# Altium footprint library TI Power Management Battery Management.PcbLib: 112 footprints (part 2 of 7)
Each footprint in its own frame and in the unit in brackets; x right, y up, seen from the top. Pads: shape width x height; smd on the part's side, far side on the other; paste and mask are expansions set on the pad; w line width, h text height; cw(c..) or ccw(c..) is an arc to the next point about the centre after c.
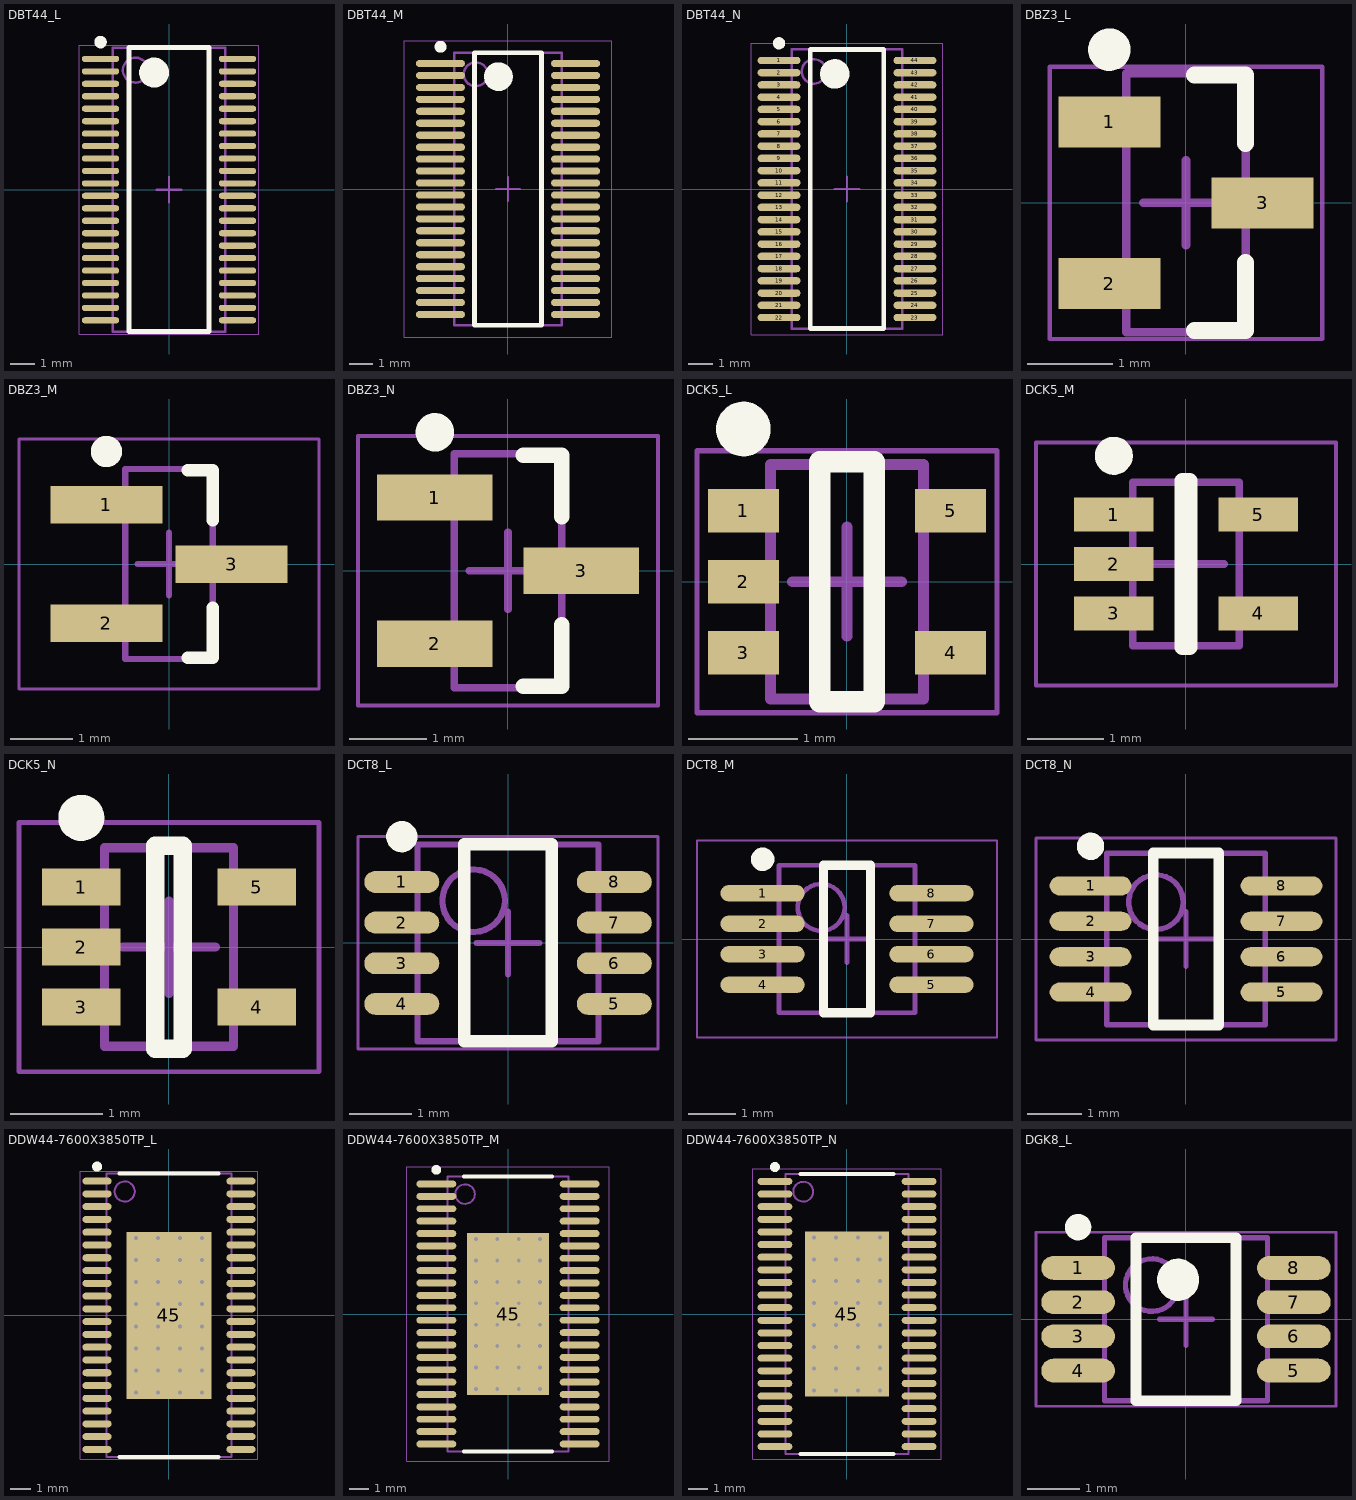
[diagram p1: the footprints below, top view; thin cyan lines are the x and y axes]

## DBT44_L [mm] "TSSOP, 44-Leads, Body 11.3x4.4mm, Pitch 0.5mm, IPC High Density"
height 1.2
pads (44):
  oval 1.5x0.25 smd: 1(-2.75,5.25) 2(-2.75,4.75) 3(-2.75,4.25) 4(-2.75,3.75) 5(-2.75,3.25) 6(-2.75,2.75) 7(-2.75,2.25) 8(-2.75,1.75) 9(-2.75,1.25) 10(-2.75,0.75) 11(-2.75,0.25) 12(-2.75,-0.25) 13(-2.75,-0.75) 14(-2.75,-1.25) 15(-2.75,-1.75) 16(-2.75,-2.25) 17(-2.75,-2.75) 18(-2.75,-3.25) 19(-2.75,-3.75) 20(-2.75,-4.25) 21(-2.75,-4.75) 22(-2.75,-5.25) 23(2.75,-5.25) 24(2.75,-4.75) 25(2.75,-4.25) 26(2.75,-3.75) 27(2.75,-3.25) 28(2.75,-2.75) 29(2.75,-2.25) 30(2.75,-1.75) 31(2.75,-1.25) 32(2.75,-0.75) 33(2.75,-0.25) 34(2.75,0.25) 35(2.75,0.75) 36(2.75,1.25) 37(2.75,1.75) 38(2.75,2.25) 39(2.75,2.75) 40(2.75,3.25) 41(2.75,3.75) 42(2.75,4.25) 43(2.75,4.75) 44(2.75,5.25)
Top Overlay:
  circle w0.25: c-2.75,5.925 r0.125
  circle w0.6: c-0.6,4.7 r0.3
  lines w0.2: -1.6,-5.7 -1.6,5.7 1.6,5.7 1.6,-5.7 -1.6,-5.7
Mechanical 13:
  circle w0.1: c-1.35,4.8 r0.5
  lines w0.1: -2.25,-5.7 -2.25,5.7 2.25,5.7 2.25,-5.7 -2.25,-5.7
Mechanical 15:
  lines w0.05: -3.6,-5.8 -3.6,5.8 3.6,5.8 3.6,-5.8 -3.6,-5.8
  lines w0.1: -0.5,0 0.5,0 ; 0,-0.5 0,0.5
3D body "User Library-TSSOP-44.step": height 1.2, standoff 0, extent -2.995,-5.95 2.995,5.95

## DBT44_M [mm] "TSSOP, 44-Leads, Body 11.3x4.4mm, Pitch 0.5mm, IPC Low Density"
height 1.2
pads (44):
  oval 2.05x0.3 smd: 1(-2.825,5.25) 2(-2.825,4.75) 3(-2.825,4.25) 4(-2.825,3.75) 5(-2.825,3.25) 6(-2.825,2.75) 7(-2.825,2.25) 8(-2.825,1.75) 9(-2.825,1.25) 10(-2.825,0.75) 11(-2.825,0.25) 12(-2.825,-0.25) 13(-2.825,-0.75) 14(-2.825,-1.25) 15(-2.825,-1.75) 16(-2.825,-2.25) 17(-2.825,-2.75) 18(-2.825,-3.25) 19(-2.825,-3.75) 20(-2.825,-4.25) 21(-2.825,-4.75) 22(-2.825,-5.25) 23(2.825,-5.25) 24(2.825,-4.75) 25(2.825,-4.25) 26(2.825,-3.75) 27(2.825,-3.25) 28(2.825,-2.75) 29(2.825,-2.25) 30(2.825,-1.75) 31(2.825,-1.25) 32(2.825,-0.75) 33(2.825,-0.25) 34(2.825,0.25) 35(2.825,0.75) 36(2.825,1.25) 37(2.825,1.75) 38(2.825,2.25) 39(2.825,2.75) 40(2.825,3.25) 41(2.825,3.75) 42(2.825,4.25) 43(2.825,4.75) 44(2.825,5.25)
Top Overlay:
  circle w0.6: c-0.4,4.7 r0.3
  circle w0.25: c-2.825,5.95 r0.125
  lines w0.2: -1.4,-5.7 1.4,-5.7 1.4,5.7 -1.4,5.7 -1.4,-5.7
Mechanical 13:
  circle w0.1: c-1.35,4.8 r0.5
  lines w0.1: -2.25,-5.7 2.25,-5.7 2.25,5.7 -2.25,5.7 -2.25,-5.7
Mechanical 15:
  lines w0.05: -4.35,-6.2 4.35,-6.2 4.35,6.2 -4.35,6.2 -4.35,-6.2
  lines w0.1: -0.5,0 0.5,0 ; 0,-0.5 0,0.5
3D body "User Library-TSSOP-44.step": height 1.2, standoff 0, extent -2.995,-5.95 2.995,5.95

## DBT44_N [mm] "TSSOP, 44-Leads, Body 11.3x4.4mm, Pitch 0.5mm, IPC Medium Density"
height 1.2
pads (44):
  oval 1.75x0.3 smd: 1(-2.775,5.25) 2(-2.775,4.75) 3(-2.775,4.25) 4(-2.775,3.75) 5(-2.775,3.25) 6(-2.775,2.75) 7(-2.775,2.25) 8(-2.775,1.75) 9(-2.775,1.25) 10(-2.775,0.75) 11(-2.775,0.25) 12(-2.775,-0.25) 13(-2.775,-0.75) 14(-2.775,-1.25) 15(-2.775,-1.75) 16(-2.775,-2.25) 17(-2.775,-2.75) 18(-2.775,-3.25) 19(-2.775,-3.75) 20(-2.775,-4.25) 21(-2.775,-4.75) 22(-2.775,-5.25) 23(2.775,-5.25) 24(2.775,-4.75) 25(2.775,-4.25) 26(2.775,-3.75) 27(2.775,-3.25) 28(2.775,-2.75) 29(2.775,-2.25) 30(2.775,-1.75) 31(2.775,-1.25) 32(2.775,-0.75) 33(2.775,-0.25) 34(2.775,0.25) 35(2.775,0.75) 36(2.775,1.25) 37(2.775,1.75) 38(2.775,2.25) 39(2.775,2.75) 40(2.775,3.25) 41(2.775,3.75) 42(2.775,4.25) 43(2.775,4.75) 44(2.775,5.25)
Top Overlay:
  circle w0.25: c-2.775,5.95 r0.125
  circle w0.6: c-0.5,4.7 r0.3
  lines w0.2: -1.5,-5.7 -1.5,5.7 1.5,5.7 1.5,-5.7 -1.5,-5.7
Mechanical 13:
  circle w0.1: c-1.35,4.8 r0.5
  lines w0.1: -2.25,-5.7 -2.25,5.7 2.25,5.7 2.25,-5.7 -2.25,-5.7
Mechanical 15:
  lines w0.05: -3.9,-5.95 -3.9,5.95 3.9,5.95 3.9,-5.95 -3.9,-5.95
  lines w0.1: -0.5,0 0.5,0 ; 0,-0.5 0,0.5
3D body "User Library-TSSOP-44.step": height 1.2, standoff 0, extent -2.995,-5.95 2.995,5.95

## DBZ3_L [mm] "SOT23, 3-Leads, Body 2.9x1.3mm, Pitch 0.95mm, Lead Span 2.4mm, IPC High Density"
height 1.12
pads (3):
  rect 1.2x0.6 smd: 1(-0.9,0.95) 2(-0.9,-0.95) 3(0.9,0)
Top Overlay:
  circle w0.25: c-0.9,1.8 r0.125
  lines w0.2: 0.1,-1.5 0.7,-1.5 0.7,-0.7 ; 0.1,1.5 0.7,1.5 0.7,0.7
Mechanical 13:
  lines w0.1: -0.7,-1.52 0.7,-1.52 0.7,1.52 -0.7,1.52 -0.7,-1.52
Mechanical 15:
  lines w0.05: -1.6,-1.6 1.6,-1.6 1.6,1.6 -1.6,1.6 -1.6,-1.6
  lines w0.1: -0.5,0 0.5,0 ; 0,-0.5 0,0.5
3D body "User Library-SOT23-3.step": height 1.3, standoff 0, extent -1.4,-1.45 1.4,1.45

## DBZ3_M [mm] "SOT23, 3-Leads, Body 2.9x1.3mm, Pitch 0.95mm, Lead Span 2.4mm, IPC Low Density"
height 1.12
pads (3):
  rect 1.8x0.6 smd: 1(-1,0.95) 2(-1,-0.95) 3(1,0)
Top Overlay:
  circle w0.25: c-1,1.8 r0.125
  lines w0.2: 0.3,-1.5 0.7,-1.5 0.7,-0.7 ; 0.3,1.5 0.7,1.5 0.7,0.7
Mechanical 13:
  lines w0.1: -0.7,-1.52 0.7,-1.52 0.7,1.52 -0.7,1.52 -0.7,-1.52
Mechanical 15:
  lines w0.05: -2.4,-2 2.4,-2 2.4,2 -2.4,2 -2.4,-2
  lines w0.1: -0.5,0 0.5,0 ; 0,-0.5 0,0.5
3D body "User Library-SOT23-3.step": height 1.3, standoff 0, extent -1.4,-1.45 1.4,1.45

## DBZ3_N [mm] "SOT23, 3-Leads, Body 2.9x1.3mm, Pitch 0.95mm, Lead Span 2.4mm, IPC Medium Density"
height 1.12
pads (3):
  rect 1.5x0.6 smd: 1(-0.95,0.95) 2(-0.95,-0.95) 3(0.95,0)
Top Overlay:
  circle w0.25: c-0.95,1.8 r0.125
  lines w0.2: 0.2,-1.5 0.7,-1.5 0.7,-0.7 ; 0.2,1.5 0.7,1.5 0.7,0.7
Mechanical 13:
  lines w0.1: -0.7,-1.52 -0.7,1.52 0.7,1.52 0.7,-1.52 -0.7,-1.52
Mechanical 15:
  lines w0.05: -1.95,-1.75 -1.95,1.75 1.95,1.75 1.95,-1.75 -1.95,-1.75
  lines w0.1: -0.5,0 0.5,0 ; 0,-0.5 0,0.5
3D body "User Library-SOT23-3.step": height 1.3, standoff 0, extent -1.4,-1.45 1.4,1.45

## DCK5_L [mm] "SOT353, 5-Leads, Body 2x1.3mm, Pitch 0.65mm, Lead Span 2.1mm, IPC High Density"
height 1.1
pads (5):
  rect 0.65x0.4 smd: 1(-0.95,0.65) 2(-0.95,0) 3(-0.95,-0.65) 4(0.95,-0.65) 5(0.95,0.65)
Top Overlay:
  circle w0.25: c-0.95,1.4 r0.125
  lines w0.2: -0.25,-1.1 0.25,-1.1 0.25,1.1 -0.25,1.1 -0.25,-1.1
Mechanical 13:
  lines w0.1: -0.7,-1.075 -0.7,1.075 0.7,1.075 0.7,-1.075 -0.7,-1.075
Mechanical 15:
  lines w0.05: -1.375,-1.2 -1.375,1.2 1.375,1.2 1.375,-1.2 -1.375,-1.2
  lines w0.1: -0.5,0 0.5,0 ; 0,-0.5 0,0.5
3D body "User Library-SOT353-1.step": height 1.1, standoff 0, extent -1.2,-1.1 1.2,1.1

## DCK5_M [mm] "SOT353, 5-Leads, Body 2x1.3mm, Pitch 0.65mm, Lead Span 2.1mm, IPC Low Density"
height 1.1
pads (5):
  rect 1.05x0.45 smd: 1(-0.95,0.65) 2(-0.95,0) 3(-0.95,-0.65) 4(0.95,-0.65) 5(0.95,0.65)
Top Overlay:
  circle w0.25: c-0.95,1.425 r0.125
  lines w0.2: -0.05,-1.1 -0.05,1.1 0.05,1.1 0.05,-1.1 -0.05,-1.1
Mechanical 13:
  lines w0.1: -0.7,-1.075 0.7,-1.075 0.7,1.075 -0.7,1.075 -0.7,-1.075
Mechanical 15:
  lines w0.05: -1.975,-1.6 1.975,-1.6 1.975,1.6 -1.975,1.6 -1.975,-1.6
  lines w0.1: -0.5,0 0.5,0 ; 0,-0.5 0,0.5
3D body "User Library-SOT353-1.step": height 1.1, standoff 0, extent -1.2,-1.1 1.2,1.1

## DCK5_N [mm] "SOT353, 5-Leads, Body 2x1.3mm, Pitch 0.65mm, Lead Span 2.1mm, IPC Medium Density"
height 1.1
pads (5):
  rect 0.85x0.4 smd: 1(-0.95,0.65) 2(-0.95,0) 3(-0.95,-0.65) 4(0.95,-0.65) 5(0.95,0.65)
Top Overlay:
  circle w0.25: c-0.95,1.4 r0.125
  lines w0.2: -0.15,-1.1 0.15,-1.1 0.15,1.1 -0.15,1.1 -0.15,-1.1
Mechanical 13:
  lines w0.1: -0.7,-1.075 -0.7,1.075 0.7,1.075 0.7,-1.075 -0.7,-1.075
Mechanical 15:
  lines w0.05: -1.625,-1.35 -1.625,1.35 1.625,1.35 1.625,-1.35 -1.625,-1.35
  lines w0.1: -0.5,0 0.5,0 ; 0,-0.5 0,0.5
3D body "User Library-SOT353-1.step": height 1.1, standoff 0, extent -1.2,-1.1 1.2,1.1

## DCT8_L [mm] "TSOP, 8-Leads, Body 3x2.8mm, Pitch 0.65mm, IPC High Density"
height 1.3
pads (8):
  oval 1.2x0.35 smd: 1(-1.7,0.975) 2(-1.7,0.325) 3(-1.7,-0.325) 4(-1.7,-0.975) 5(1.7,-0.975) 6(1.7,-0.325) 7(1.7,0.325) 8(1.7,0.975)
Top Overlay:
  circle w0.25: c-1.7,1.7 r0.125
  lines w0.2: -0.7,-1.575 0.7,-1.575 0.7,1.575 -0.7,1.575 -0.7,-1.575
Mechanical 13:
  circle w0.1: c-0.55,0.675 r0.5
  lines w0.1: -1.45,-1.575 1.45,-1.575 1.45,1.575 -1.45,1.575 -1.45,-1.575
Mechanical 15:
  lines w0.05: -2.4,-1.7 2.4,-1.7 2.4,1.7 -2.4,1.7 -2.4,-1.7
  lines w0.1: -0.5,0 0.5,0 ; 0,-0.5 0,0.5
3D body "User Library-SSOP-8-1.step": height 1.28, standoff -0.02, extent -2.148,-1.564 2.102,1.586

## DCT8_M [mm] "TSOP, 8-Leads, Body 3x2.8mm, Pitch 0.65mm, IPC Low Density"
height 1.3
pads (8):
  oval 1.8x0.35 smd: 1(-1.8,0.975) 2(-1.8,0.325) 3(-1.8,-0.325) 4(-1.8,-0.975) 5(1.8,-0.975) 6(1.8,-0.325) 7(1.8,0.325) 8(1.8,0.975)
Top Overlay:
  circle w0.25: c-1.8,1.7 r0.125
  lines w0.2: -0.5,-1.575 -0.5,1.575 0.5,1.575 0.5,-1.575 -0.5,-1.575
Mechanical 13:
  circle w0.1: c-0.55,0.675 r0.5
  lines w0.1: -1.45,-1.575 -1.45,1.575 1.45,1.575 1.45,-1.575 -1.45,-1.575
Mechanical 15:
  lines w0.05: -3.2,-2.1 -3.2,2.1 3.2,2.1 3.2,-2.1 -3.2,-2.1
  lines w0.1: -0.5,0 0.5,0 ; 0,-0.5 0,0.5
3D body "User Library-SSOP-8-1.step": height 1.28, standoff -0.02, extent -2.148,-1.59 2.102,1.56

## DCT8_N [mm] "TSOP, 8-Leads, Body 3x2.8mm, Pitch 0.65mm, IPC Medium Density"
height 1.3
pads (8):
  oval 1.5x0.35 smd: 1(-1.75,0.975) 2(-1.75,0.325) 3(-1.75,-0.325) 4(-1.75,-0.975) 5(1.75,-0.975) 6(1.75,-0.325) 7(1.75,0.325) 8(1.75,0.975)
Top Overlay:
  circle w0.25: c-1.75,1.7 r0.125
  lines w0.2: -0.6,-1.575 -0.6,1.575 0.6,1.575 0.6,-1.575 -0.6,-1.575
Mechanical 13:
  circle w0.1: c-0.55,0.675 r0.5
  lines w0.1: -1.45,-1.575 -1.45,1.575 1.45,1.575 1.45,-1.575 -1.45,-1.575
Mechanical 15:
  lines w0.05: -2.75,-1.85 -2.75,1.85 2.75,1.85 2.75,-1.85 -2.75,-1.85
  lines w0.1: -0.5,0 0.5,0 ; 0,-0.5 0,0.5
3D body "User Library-SSOP-8-1.step": height 1.28, standoff -0.02, extent -2.123,-1.564 2.127,1.586

## DDW44-7600X3850TP_L [mm] "TSOP, 44-Leads, Body 14x6.1mm, Pitch 0.635mm, Thermal Pad 8.3x4.2mm, IPC High Density"
height 1.2
pads (45):
  oval 1.45x0.35 smd: 1(-3.575,6.667) 2(-3.575,6.032) 3(-3.575,5.397) 4(-3.575,4.763) 5(-3.575,4.127) 6(-3.575,3.492) 7(-3.575,2.857) 8(-3.575,2.222) 9(-3.575,1.587) 10(-3.575,0.953) 11(-3.575,0.318) 12(-3.575,-0.318) 13(-3.575,-0.953) 14(-3.575,-1.587) 15(-3.575,-2.222) 16(-3.575,-2.857) 17(-3.575,-3.492) 18(-3.575,-4.127) 19(-3.575,-4.763) 20(-3.575,-5.397) 21(-3.575,-6.032) 22(-3.575,-6.667) 23(3.575,-6.667) 24(3.575,-6.032) 25(3.575,-5.397) 26(3.575,-4.763) 27(3.575,-4.127) 28(3.575,-3.492) 29(3.575,-2.857) 30(3.575,-2.222) 31(3.575,-1.587) 32(3.575,-0.953) 33(3.575,-0.318) 34(3.575,0.318) 35(3.575,0.953) 36(3.575,1.587) 37(3.575,2.222) 38(3.575,2.857) 39(3.575,3.492) 40(3.575,4.127) 41(3.575,4.763) 42(3.575,5.397) 43(3.575,6.032) 44(3.575,6.667)
  rect 4.2x8.3 smd: 45(0,0)
via -0.55,1.65 diameter 0.5 hole 0.2
via -0.55,0.55 diameter 0.5 hole 0.2
via -0.55,-0.55 diameter 0.5 hole 0.2
via -0.55,-1.65 diameter 0.5 hole 0.2
via -0.55,-2.75 diameter 0.5 hole 0.2
via 0.55,-2.75 diameter 0.5 hole 0.2
via 0.55,-1.65 diameter 0.5 hole 0.2
via 0.55,-0.55 diameter 0.5 hole 0.2
via 0.55,0.55 diameter 0.5 hole 0.2
via 0.55,1.65 diameter 0.5 hole 0.2
via 0.55,2.75 diameter 0.5 hole 0.2
via -0.55,2.75 diameter 0.5 hole 0.2
via -1.65,2.75 diameter 0.5 hole 0.2
via -1.65,1.65 diameter 0.5 hole 0.2
via -1.65,0.55 diameter 0.5 hole 0.2
via -1.65,-0.55 diameter 0.5 hole 0.2
via -1.65,-1.65 diameter 0.5 hole 0.2
via -1.65,-2.75 diameter 0.5 hole 0.2
via -1.65,-3.85 diameter 0.5 hole 0.2
via -0.55,-3.85 diameter 0.5 hole 0.2
via 0.55,-3.85 diameter 0.5 hole 0.2
via 1.65,-3.85 diameter 0.5 hole 0.2
via 1.65,-2.75 diameter 0.5 hole 0.2
via 1.65,-1.65 diameter 0.5 hole 0.2
via 1.65,-0.55 diameter 0.5 hole 0.2
via 1.65,0.55 diameter 0.5 hole 0.2
via 1.65,1.65 diameter 0.5 hole 0.2
via 1.65,2.75 diameter 0.5 hole 0.2
via 1.65,3.85 diameter 0.5 hole 0.2
via 0.55,3.85 diameter 0.5 hole 0.2
via -0.55,3.85 diameter 0.5 hole 0.2
via -1.65,3.85 diameter 0.5 hole 0.2
Top Overlay:
  circle w0.25: c-3.575,7.392 r0.125
  lines w0.2: -2.45,-7.05 2.45,-7.05 ; -2.45,7.05 2.45,7.05
Mechanical 13:
  circle w0.1: c-2.2,6.15 r0.5
  lines w0.1: -3.1,-7.05 -3.1,7.05 3.1,7.05 3.1,-7.05 -3.1,-7.05
Mechanical 15:
  lines w0.05: -4.4,-7.15 -4.4,7.15 4.4,7.15 4.4,-7.15 -4.4,-7.15
  lines w0.1: -0.5,0 0.5,0 ; 0,-0.5 0,0.5
3D body "User Library-HTSSOP44.step": height 1.2, standoff 0, extent -4.05,-7.05 4.05,7.05

## DDW44-7600X3850TP_M [mm] "TSOP, 44-Leads, Body 14x6.1mm, Pitch 0.635mm, Thermal Pad 8.3x4.2mm, IPC Low Density"
height 1.2
pads (45):
  oval 2.05x0.35 smd: 1(-3.675,6.667) 2(-3.675,6.032) 3(-3.675,5.397) 4(-3.675,4.763) 5(-3.675,4.127) 6(-3.675,3.492) 7(-3.675,2.857) 8(-3.675,2.222) 9(-3.675,1.587) 10(-3.675,0.953) 11(-3.675,0.318) 12(-3.675,-0.318) 13(-3.675,-0.953) 14(-3.675,-1.587) 15(-3.675,-2.222) 16(-3.675,-2.857) 17(-3.675,-3.492) 18(-3.675,-4.127) 19(-3.675,-4.763) 20(-3.675,-5.397) 21(-3.675,-6.032) 22(-3.675,-6.667) 23(3.675,-6.667) 24(3.675,-6.032) 25(3.675,-5.397) 26(3.675,-4.763) 27(3.675,-4.127) 28(3.675,-3.492) 29(3.675,-2.857) 30(3.675,-2.222) 31(3.675,-1.587) 32(3.675,-0.953) 33(3.675,-0.318) 34(3.675,0.318) 35(3.675,0.953) 36(3.675,1.587) 37(3.675,2.222) 38(3.675,2.857) 39(3.675,3.492) 40(3.675,4.127) 41(3.675,4.763) 42(3.675,5.397) 43(3.675,6.032) 44(3.675,6.667)
  rect 4.2x8.3 smd: 45(0,0)
via -1.65,3.85 diameter 0.5 hole 0.2
via -0.55,3.85 diameter 0.5 hole 0.2
via 0.55,3.85 diameter 0.5 hole 0.2
via 1.65,3.85 diameter 0.5 hole 0.2
via 1.65,2.75 diameter 0.5 hole 0.2
via 1.65,1.65 diameter 0.5 hole 0.2
via 1.65,0.55 diameter 0.5 hole 0.2
via 1.65,-0.55 diameter 0.5 hole 0.2
via 1.65,-1.65 diameter 0.5 hole 0.2
via 1.65,-2.75 diameter 0.5 hole 0.2
via 1.65,-3.85 diameter 0.5 hole 0.2
via 0.55,-3.85 diameter 0.5 hole 0.2
via -0.55,-3.85 diameter 0.5 hole 0.2
via -1.65,-3.85 diameter 0.5 hole 0.2
via -1.65,-2.75 diameter 0.5 hole 0.2
via -1.65,-1.65 diameter 0.5 hole 0.2
via -1.65,-0.55 diameter 0.5 hole 0.2
via -1.65,0.55 diameter 0.5 hole 0.2
via -1.65,1.65 diameter 0.5 hole 0.2
via -1.65,2.75 diameter 0.5 hole 0.2
via -0.55,2.75 diameter 0.5 hole 0.2
via 0.55,2.75 diameter 0.5 hole 0.2
via 0.55,1.65 diameter 0.5 hole 0.2
via 0.55,0.55 diameter 0.5 hole 0.2
via 0.55,-0.55 diameter 0.5 hole 0.2
via 0.55,-1.65 diameter 0.5 hole 0.2
via 0.55,-2.75 diameter 0.5 hole 0.2
via -0.55,-2.75 diameter 0.5 hole 0.2
via -0.55,-1.65 diameter 0.5 hole 0.2
via -0.55,-0.55 diameter 0.5 hole 0.2
via -0.55,0.55 diameter 0.5 hole 0.2
via -0.55,1.65 diameter 0.5 hole 0.2
Top Overlay:
  circle w0.25: c-3.675,7.392 r0.125
  lines w0.2: -2.25,-7.05 2.25,-7.05 ; -2.25,7.05 2.25,7.05
Mechanical 13:
  circle w0.1: c-2.2,6.15 r0.5
  lines w0.1: -3.1,-7.05 3.1,-7.05 3.1,7.05 -3.1,7.05 -3.1,-7.05
Mechanical 15:
  lines w0.05: -5.2,-7.55 5.2,-7.55 5.2,7.55 -5.2,7.55 -5.2,-7.55
  lines w0.1: -0.5,0 0.5,0 ; 0,-0.5 0,0.5
3D body "User Library-HTSSOP44.step": height 1.2, standoff 0, extent -4.05,-7.05 4.05,7.05

## DDW44-7600X3850TP_N [mm] "TSOP, 44-Leads, Body 14x6.1mm, Pitch 0.635mm, Thermal Pad 8.3x4.2mm, IPC Medium Density"
height 1.2
pads (45):
  oval 1.75x0.35 smd: 1(-3.625,6.667) 2(-3.625,6.032) 3(-3.625,5.397) 4(-3.625,4.763) 5(-3.625,4.127) 6(-3.625,3.492) 7(-3.625,2.857) 8(-3.625,2.222) 9(-3.625,1.587) 10(-3.625,0.953) 11(-3.625,0.318) 12(-3.625,-0.318) 13(-3.625,-0.953) 14(-3.625,-1.587) 15(-3.625,-2.222) 16(-3.625,-2.857) 17(-3.625,-3.492) 18(-3.625,-4.127) 19(-3.625,-4.763) 20(-3.625,-5.397) 21(-3.625,-6.032) 22(-3.625,-6.667) 23(3.625,-6.667) 24(3.625,-6.032) 25(3.625,-5.397) 26(3.625,-4.763) 27(3.625,-4.127) 28(3.625,-3.492) 29(3.625,-2.857) 30(3.625,-2.222) 31(3.625,-1.587) 32(3.625,-0.953) 33(3.625,-0.318) 34(3.625,0.318) 35(3.625,0.953) 36(3.625,1.587) 37(3.625,2.222) 38(3.625,2.857) 39(3.625,3.492) 40(3.625,4.127) 41(3.625,4.763) 42(3.625,5.397) 43(3.625,6.032) 44(3.625,6.667)
  rect 4.2x8.3 smd: 45(0,0)
via -1.65,3.85 diameter 0.5 hole 0.2
via -0.55,3.85 diameter 0.5 hole 0.2
via 0.55,3.85 diameter 0.5 hole 0.2
via 1.65,3.85 diameter 0.5 hole 0.2
via 1.65,2.75 diameter 0.5 hole 0.2
via 1.65,1.65 diameter 0.5 hole 0.2
via 1.65,0.55 diameter 0.5 hole 0.2
via 1.65,-0.55 diameter 0.5 hole 0.2
via 1.65,-1.65 diameter 0.5 hole 0.2
via 1.65,-2.75 diameter 0.5 hole 0.2
via 1.65,-3.85 diameter 0.5 hole 0.2
via 0.55,-3.85 diameter 0.5 hole 0.2
via -0.55,-3.85 diameter 0.5 hole 0.2
via -1.65,-3.85 diameter 0.5 hole 0.2
via -1.65,-2.75 diameter 0.5 hole 0.2
via -1.65,-1.65 diameter 0.5 hole 0.2
via -1.65,-0.55 diameter 0.5 hole 0.2
via -1.65,0.55 diameter 0.5 hole 0.2
via -1.65,1.65 diameter 0.5 hole 0.2
via -1.65,2.75 diameter 0.5 hole 0.2
via -0.55,2.75 diameter 0.5 hole 0.2
via 0.55,2.75 diameter 0.5 hole 0.2
via 0.55,1.65 diameter 0.5 hole 0.2
via 0.55,0.55 diameter 0.5 hole 0.2
via 0.55,-0.55 diameter 0.5 hole 0.2
via 0.55,-1.65 diameter 0.5 hole 0.2
via 0.55,-2.75 diameter 0.5 hole 0.2
via -0.55,-2.75 diameter 0.5 hole 0.2
via -0.55,-1.65 diameter 0.5 hole 0.2
via -0.55,-0.55 diameter 0.5 hole 0.2
via -0.55,0.55 diameter 0.5 hole 0.2
via -0.55,1.65 diameter 0.5 hole 0.2
Top Overlay:
  circle w0.25: c-3.625,7.392 r0.125
  lines w0.2: -2.35,-7.05 2.35,-7.05 ; -2.35,7.05 2.35,7.05
Mechanical 13:
  circle w0.1: c-2.2,6.15 r0.5
  lines w0.1: -3.1,-7.05 3.1,-7.05 3.1,7.05 -3.1,7.05 -3.1,-7.05
Mechanical 15:
  lines w0.05: -4.75,-7.3 4.75,-7.3 4.75,7.3 -4.75,7.3 -4.75,-7.3
  lines w0.1: -0.5,0 0.5,0 ; 0,-0.5 0,0.5
3D body "User Library-HTSSOP44.step": height 1.2, standoff 0, extent -4.05,-7.05 4.05,7.05

## DGK8_L [mm] "TSOP, 8-Leads, Body 3x3mm, Pitch 0.65mm, IPC High Density"
height 1.1
pads (8):
  oval 1.4x0.45 smd: 1(-2.05,0.975) 2(-2.05,0.325) 3(-2.05,-0.325) 4(-2.05,-0.975) 5(2.05,-0.975) 6(2.05,-0.325) 7(2.05,0.325) 8(2.05,0.975)
Top Overlay:
  circle w0.4: c-0.15,0.75 r0.2
  circle w0.25: c-2.05,1.75 r0.125
  lines w0.2: -0.95,-1.55 0.95,-1.55 0.95,1.55 -0.95,1.55 -0.95,-1.55
Mechanical 13:
  circle w0.1: c-0.65,0.65 r0.5
  lines w0.1: -1.55,-1.55 1.55,-1.55 1.55,1.55 -1.55,1.55 -1.55,-1.55
Mechanical 15:
  lines w0.05: -2.85,-1.65 2.85,-1.65 2.85,1.65 -2.85,1.65 -2.85,-1.65
  lines w0.1: -0.5,0 0.5,0 ; 0,-0.5 0,0.5
3D body "User Library-SSOP-8-1.step": height 1.28, standoff -0.02, extent -2.123,-1.59 2.127,1.56